# Altium schematic symbol library Regulator_Linear.SchLib: 1538 symbols (part 7 of 9) (continued)
## NCP1117-12_SOT223
designator *  value NCP1117-12_SOT223  Reference: U
ki_keywords: REGULATOR LDO 12V; ki_description: 1A Low drop-out regulator, Fixed Output 12V, SOT-223; ki_fp_filters: SOT?223*TabPin2*; Footprint: Package_TO_SOT_SMD:SOT-223-3_TabPin2; Datasheet: http://www.onsemi.com/pub_link/Collateral/NCP1117-D.PDF
pins: 1 GND, 2 VO, 3 VI

## NCP1117-12_TO252
designator *  value NCP1117-12_TO252  Reference: U
ki_keywords: REGULATOR LDO 12V; ki_description: 1A Low drop-out regulator, Fixed Output 12V, TO-252 (DPAK); ki_fp_filters: TO?252*; Footprint: Package_TO_SOT_SMD:TO-252-2; Datasheet: http://www.onsemi.com/pub_link/Collateral/NCP1117-D.PDF
pins: 1 GND, 2 VO, 3 VI

## NCP1117-ADJ_SOT223
designator *  value NCP1117-ADJ_SOT223  Reference: U
ki_keywords: REGULATOR LDO 12V; ki_description: 1A Low drop-out regulator, Adjustable Output 1.25 - 18.8V, SOT-223; ki_fp_filters: SOT?223*TabPin2*; Footprint: Package_TO_SOT_SMD:SOT-223-3_TabPin2; Datasheet: http://www.onsemi.com/pub_link/Collateral/NCP1117-D.PDF
pins: 1 ADJ, 2 VO, 3 VI

## NCP1117-ADJ_TO252
designator *  value NCP1117-ADJ_TO252  Reference: U
ki_keywords: REGULATOR LDO ADJUSTABLE; ki_description: 1A Low drop-out regulator, Adjustable Output 1.25 - 18.8V, TO-252 (DPAK); ki_fp_filters: TO?252*; Footprint: Package_TO_SOT_SMD:TO-252-2; Datasheet: http://www.onsemi.com/pub_link/Collateral/NCP1117-D.PDF
pins: 1 ADJ, 2 VO, 3 VI

## NCV8114ASN120T1G
designator *  value NCV8114ASN120T1G  Reference: U
ki_keywords: linear regulator ldo fixed positive; ki_description: 300mA, Low Noise, Linear Regulator with output active discharge function, 1.7-5.5V input voltage range, 1.2V fixed positive output, TSOT-23-5; ki_fp_filters: TSOT?23*; Footprint: Package_TO_SOT_SMD:TSOT-23-5; Datasheet: https://ru.mouser.com/datasheet/2/308/NCV8114-D-1107616.pdf
pins: 1 IN, 2 GND, 3 EN, 4 NC hidden, 5 OUT

## NCV8114ASN150T1G
designator *  value NCV8114ASN150T1G  Reference: U
ki_keywords: linear regulator ldo fixed positive; ki_description: 300mA, Low Noise, Linear Regulator with output active discharge function, 1.7-5.5V input voltage range, 1.5V fixed positive output, TSOT-23-5; ki_fp_filters: TSOT?23*; Footprint: Package_TO_SOT_SMD:TSOT-23-5; Datasheet: https://ru.mouser.com/datasheet/2/308/NCV8114-D-1107616.pdf
pins: 1 IN, 2 GND, 3 EN, 4 NC hidden, 5 OUT

## NCV8114ASN165T1G
designator *  value NCV8114ASN165T1G  Reference: U
ki_keywords: linear regulator ldo fixed positive; ki_description: 300mA, Low Noise, Linear Regulator with output active discharge function, 1.7-5.5V input voltage range, 1.65V fixed positive output, TSOT-23-5; ki_fp_filters: TSOT?23*; Footprint: Package_TO_SOT_SMD:TSOT-23-5; Datasheet: https://ru.mouser.com/datasheet/2/308/NCV8114-D-1107616.pdf
pins: 1 IN, 2 GND, 3 EN, 4 NC hidden, 5 OUT

## NCV8114ASN180T1G
designator *  value NCV8114ASN180T1G  Reference: U
ki_keywords: linear regulator ldo fixed positive; ki_description: 300mA, Low Noise, Linear Regulator with output active discharge function, 1.7-5.5V input voltage range, 1.8V fixed positive output, TSOT-23-5; ki_fp_filters: TSOT?23*; Footprint: Package_TO_SOT_SMD:TSOT-23-5; Datasheet: https://ru.mouser.com/datasheet/2/308/NCV8114-D-1107616.pdf
pins: 1 IN, 2 GND, 3 EN, 4 NC hidden, 5 OUT

## NCV8114ASN250T1G
designator *  value NCV8114ASN250T1G  Reference: U
ki_keywords: linear regulator ldo fixed positive; ki_description: 300mA, Low Noise, Linear Regulator with output active discharge function, 1.7-5.5V input voltage range, 2.5V fixed positive output, TSOT-23-5; ki_fp_filters: TSOT?23*; Footprint: Package_TO_SOT_SMD:TSOT-23-5; Datasheet: https://ru.mouser.com/datasheet/2/308/NCV8114-D-1107616.pdf
pins: 1 IN, 2 GND, 3 EN, 4 NC hidden, 5 OUT

## NCV8114ASN280T1G
designator *  value NCV8114ASN280T1G  Reference: U
ki_keywords: linear regulator ldo fixed positive; ki_description: 300mA, Low Noise, Linear Regulator with output active discharge function, 1.7-5.5V input voltage range, 2.8V fixed positive output, TSOT-23-5; ki_fp_filters: TSOT?23*; Footprint: Package_TO_SOT_SMD:TSOT-23-5; Datasheet: https://ru.mouser.com/datasheet/2/308/NCV8114-D-1107616.pdf
pins: 1 IN, 2 GND, 3 EN, 4 NC hidden, 5 OUT

## NCV8114ASN300T1G
designator *  value NCV8114ASN300T1G  Reference: U
ki_keywords: linear regulator ldo fixed positive; ki_description: 300mA, Low Noise, Linear Regulator with output active discharge function, 1.7-5.5V input voltage range, 3.0V fixed positive output, TSOT-23-5; ki_fp_filters: TSOT?23*; Footprint: Package_TO_SOT_SMD:TSOT-23-5; Datasheet: https://ru.mouser.com/datasheet/2/308/NCV8114-D-1107616.pdf
pins: 1 IN, 2 GND, 3 EN, 4 NC hidden, 5 OUT

## NCV8114ASN330T1G
designator *  value NCV8114ASN330T1G  Reference: U
ki_keywords: linear regulator ldo fixed positive; ki_description: 300mA, Low Noise, Linear Regulator with output active discharge function, 1.7-5.5V input voltage range, 3.3V fixed positive output, TSOT-23-5; ki_fp_filters: TSOT?23*; Footprint: Package_TO_SOT_SMD:TSOT-23-5; Datasheet: https://ru.mouser.com/datasheet/2/308/NCV8114-D-1107616.pdf
pins: 1 IN, 2 GND, 3 EN, 4 NC hidden, 5 OUT

## NCV8114BSN120T1G
designator *  value NCV8114BSN120T1G  Reference: U
ki_keywords: linear regulator ldo fixed positive; ki_description: 300mA, Low Noise, Linear Regulator without output active discharge function, 1.7-5.5V input voltage range, 1.2V fixed positive output, TSOT-23-5; ki_fp_filters: TSOT?23*; Footprint: Package_TO_SOT_SMD:TSOT-23-5; Datasheet: https://ru.mouser.com/datasheet/2/308/NCV8114-D-1107616.pdf
pins: 1 IN, 2 GND, 3 EN, 4 NC hidden, 5 OUT

## NCV8114BSN150T1G
designator *  value NCV8114BSN150T1G  Reference: U
ki_keywords: linear regulator ldo fixed positive; ki_description: 300mA, Low Noise, Linear Regulator without output active discharge function, 1.7-5.5V input voltage range, 1.5V fixed positive output, TSOT-23-5; ki_fp_filters: TSOT?23*; Footprint: Package_TO_SOT_SMD:TSOT-23-5; Datasheet: https://ru.mouser.com/datasheet/2/308/NCV8114-D-1107616.pdf
pins: 1 IN, 2 GND, 3 EN, 4 NC hidden, 5 OUT

## NCV8114BSN180T1G
designator *  value NCV8114BSN180T1G  Reference: U
ki_keywords: linear regulator ldo fixed positive; ki_description: 300mA, Low Noise, Linear Regulator without output active discharge function, 1.7-5.5V input voltage range, 1.8V fixed positive output, TSOT-23-5; ki_fp_filters: TSOT?23*; Footprint: Package_TO_SOT_SMD:TSOT-23-5; Datasheet: https://ru.mouser.com/datasheet/2/308/NCV8114-D-1107616.pdf
pins: 1 IN, 2 GND, 3 EN, 4 NC hidden, 5 OUT

## NCV8114BSN280T1G
designator *  value NCV8114BSN280T1G  Reference: U
ki_keywords: linear regulator ldo fixed positive; ki_description: 300mA, Low Noise, Linear Regulator without output active discharge function, 1.7-5.5V input voltage range, 2.8V fixed positive output, TSOT-23-5; ki_fp_filters: TSOT?23*; Footprint: Package_TO_SOT_SMD:TSOT-23-5; Datasheet: https://ru.mouser.com/datasheet/2/308/NCV8114-D-1107616.pdf
pins: 1 IN, 2 GND, 3 EN, 4 NC hidden, 5 OUT

## NCV8114BSN300T1G
designator *  value NCV8114BSN300T1G  Reference: U
ki_keywords: linear regulator ldo fixed positive; ki_description: 300mA, Low Noise, Linear Regulator without output active discharge function, 1.7-5.5V input voltage range, 3.0V fixed positive output, TSOT-23-5; ki_fp_filters: TSOT?23*; Footprint: Package_TO_SOT_SMD:TSOT-23-5; Datasheet: https://ru.mouser.com/datasheet/2/308/NCV8114-D-1107616.pdf
pins: 1 IN, 2 GND, 3 EN, 4 NC hidden, 5 OUT

## NCV8114BSN330T1G
designator *  value NCV8114BSN330T1G  Reference: U
ki_keywords: linear regulator ldo fixed positive; ki_description: 300mA, Low Noise, Linear Regulator without output active discharge function, 1.7-5.5V input voltage range, 3.3V fixed positive output, TSOT-23-5; ki_fp_filters: TSOT?23*; Footprint: Package_TO_SOT_SMD:TSOT-23-5; Datasheet: https://ru.mouser.com/datasheet/2/308/NCV8114-D-1107616.pdf
pins: 1 IN, 2 GND, 3 EN, 4 NC hidden, 5 OUT

## NVC8674DS50
designator *  value NVC8674DS50  Reference: U
ki_keywords: ldo regulator 5V; ki_description: 350mA, 5.0V Very Low Iq Low Dropout Linear Regulator, TO-263-2; ki_fp_filters: TO*263*; Footprint: Package_TO_SOT_SMD:TO-263-2; Datasheet: https://www.onsemi.com/pub/Collateral/NCV8674-D.PDF
pins: 1 IN, 2 GND, 3 OUT

## NVC8674DS120
designator *  value NVC8674DS120  Reference: U
ki_keywords: ldo regulator 12V; ki_description: 350mA, 12.0V Very Low Iq Low Dropout Linear Regulator, TO-263-2; ki_fp_filters: TO*263*; Footprint: Package_TO_SOT_SMD:TO-263-2; Datasheet: https://www.onsemi.com/pub/Collateral/NCV8674-D.PDF
pins: 1 IN, 2 GND, 3 OUT

## OM1323_TO220
designator *  value OM1323_TO220  Reference: U
ki_keywords: Adjustable Voltage Regulator 1.5A Negative; ki_description: Negative 1.5A 35V Adjustable Linear Regulator, TO-220; ki_fp_filters: TO?220*; Footprint: Package_TO_SOT_THT:TO-220-3_Vertical; Datasheet: http://www.irf.com/product-info/datasheets/hirel/om1323.pdf
pins: 1 ADJ, 2 VI, 3 VO

## SPX2920M3-3.3_SOT223
designator *  value SPX2920M3-3.3_SOT223  Reference: U
ki_keywords: REGULATOR LDO 3.3V; ki_description: 400mA Low drop-out regulator, Fixed Output 3.3V, SOT-223; ki_fp_filters: SOT?223*; Footprint: Package_TO_SOT_SMD:SOT-223-3_TabPin2; Datasheet: http://www.zlgmcu.com/Sipex/LDO/PDF/spx2920.pdf
pins: 1 VI, 2 GND, 3 VO

## SPX2920M3-5.0_SOT223
designator *  value SPX2920M3-5.0_SOT223  Reference: U
ki_keywords: REGULATOR LDO 5V; ki_description: 400mA Low drop-out regulator, Fixed Output 5V, SOT-223; ki_fp_filters: SOT?223*; Footprint: Package_TO_SOT_SMD:SOT-223-3_TabPin2; Datasheet: http://www.zlgmcu.com/Sipex/LDO/PDF/spx2920.pdf
pins: 1 VI, 2 GND, 3 VO

## SPX2920S-3.3_SO8
designator *  value SPX2920S-3.3_SO8  Reference: U
ki_keywords: LDO Voltage Regulator 400mA 3.3V Adjustable; ki_description: 400mA Fixed/Adjustable 1.2-20V Low Drop-out Voltage Regulator, SO-8; ki_fp_filters: SOIC*3.9x4.9mm*P1.27mm*; Footprint: Package_SO:SOIC-8_3.9x4.9mm_P1.27mm; Datasheet: http://www.zlgmcu.com/Sipex/LDO/PDF/spx2920.pdf
pins: 1 OUT, 2 SENSE, 3 ~{{SD}}, 4 GND, 5 ~{{ERROR}}, 6 TAP, 7 FB, 8 IN

## SPX2920S-5.0_SO8
designator *  value SPX2920S-5.0_SO8  Reference: U
ki_keywords: LDO Voltage Regulator 400mA 5V Adjustable; ki_description: 400mA Fixed/Adjustable 1.2-20V Low Drop-out Voltage Regulator, SO-8; ki_fp_filters: SOIC*3.9x4.9mm*P1.27mm*; Footprint: Package_SO:SOIC-8_3.9x4.9mm_P1.27mm; Datasheet: http://www.zlgmcu.com/Sipex/LDO/PDF/spx2920.pdf
pins: 1 OUT, 2 SENSE, 3 ~{{SD}}, 4 GND, 5 ~{{ERROR}}, 6 TAP, 7 FB, 8 IN

## SPX2920T-3.3_TO263
designator *  value SPX2920T-3.3_TO263  Reference: U
ki_keywords: REGULATOR LDO 3.3V; ki_description: 400mA Low drop-out regulator, Fixed Output 3.3V, TO-263; ki_fp_filters: TO?263*; Footprint: Package_TO_SOT_SMD:TO-263-3_TabPin2; Datasheet: http://www.zlgmcu.com/Sipex/LDO/PDF/spx2920.pdf
pins: 1 VI, 2 GND, 3 VO

## SPX2920T-5.0_TO263
designator *  value SPX2920T-5.0_TO263  Reference: U
ki_keywords: REGULATOR LDO 5V; ki_description: 400mA Low drop-out regulator, Fixed Output 5V, TO-263; ki_fp_filters: TO?263*; Footprint: Package_TO_SOT_SMD:TO-263-3_TabPin2; Datasheet: http://www.zlgmcu.com/Sipex/LDO/PDF/spx2920.pdf
pins: 1 VI, 2 GND, 3 VO

## SPX2920U-3.3_TO220
designator *  value SPX2920U-3.3_TO220  Reference: U
ki_keywords: REGULATOR LDO 3.3V; ki_description: 400mA Low drop-out regulator, Fixed Output 3.3V, TO-220; ki_fp_filters: TO?220*; Footprint: Package_TO_SOT_THT:TO-220-3_Vertical; Datasheet: http://www.zlgmcu.com/Sipex/LDO/PDF/spx2920.pdf
pins: 1 VI, 2 GND, 3 VO

## SPX2920U-5.0_TO220
designator *  value SPX2920U-5.0_TO220  Reference: U
ki_keywords: REGULATOR LDO 5V; ki_description: 400mA Low drop-out regulator, Fixed Output 5V, TO-220; ki_fp_filters: TO?220*; Footprint: Package_TO_SOT_THT:TO-220-3_Vertical; Datasheet: http://www.zlgmcu.com/Sipex/LDO/PDF/spx2920.pdf
pins: 1 VI, 2 GND, 3 VO

## SPX3819M5-L
designator *  value SPX3819M5-L  Reference: U
ki_keywords: REGULATOR LDO ADJ; ki_description: 500mA Low drop-out regulator, Adjustable, SOT-23-5; ki_fp_filters: SOT?23*; Footprint: Package_TO_SOT_SMD:SOT-23-5; Datasheet: https://www.exar.com/content/document.ashx?id=22106&languageid=1033&type=Datasheet&partnumber=SPX3819&filename=SPX3819.pdf&part=SPX3819
pins: 1 IN, 2 GND, 3 EN, 4 ADJ, 5 OUT

## SPX3819M5-L-1-2
designator *  value SPX3819M5-L-1-2  Reference: U
ki_keywords: REGULATOR LDO 1.2V; ki_description: 500mA Low drop-out regulator, Fixed Output 1.2V, SOT-23-5; ki_fp_filters: SOT?23*; Footprint: Package_TO_SOT_SMD:SOT-23-5; Datasheet: https://www.exar.com/content/document.ashx?id=22106&languageid=1033&type=Datasheet&partnumber=SPX3819&filename=SPX3819.pdf&part=SPX3819
pins: 1 IN, 2 GND, 3 EN, 4 BP, 5 OUT

## SPX3819M5-L-1-5
designator *  value SPX3819M5-L-1-5  Reference: U
ki_keywords: REGULATOR LDO 1.5V; ki_description: 500mA Low drop-out regulator, Fixed Output 1.5V, SOT-23-5; ki_fp_filters: SOT?23*; Footprint: Package_TO_SOT_SMD:SOT-23-5; Datasheet: https://www.exar.com/content/document.ashx?id=22106&languageid=1033&type=Datasheet&partnumber=SPX3819&filename=SPX3819.pdf&part=SPX3819
pins: 1 IN, 2 GND, 3 EN, 4 BP, 5 OUT

## SPX3819M5-L-1-8
designator *  value SPX3819M5-L-1-8  Reference: U
ki_keywords: REGULATOR LDO 1.8V; ki_description: 500mA Low drop-out regulator, Fixed Output 1.8V, SOT-23-5; ki_fp_filters: SOT?23*; Footprint: Package_TO_SOT_SMD:SOT-23-5; Datasheet: https://www.exar.com/content/document.ashx?id=22106&languageid=1033&type=Datasheet&partnumber=SPX3819&filename=SPX3819.pdf&part=SPX3819
pins: 1 IN, 2 GND, 3 EN, 4 BP, 5 OUT

## SPX3819M5-L-2-5
designator *  value SPX3819M5-L-2-5  Reference: U
ki_keywords: REGULATOR LDO 2.5V; ki_description: 500mA Low drop-out regulator, Fixed Output 2.5V, SOT-23-5; ki_fp_filters: SOT?23*; Footprint: Package_TO_SOT_SMD:SOT-23-5; Datasheet: https://www.exar.com/content/document.ashx?id=22106&languageid=1033&type=Datasheet&partnumber=SPX3819&filename=SPX3819.pdf&part=SPX3819
pins: 1 IN, 2 GND, 3 EN, 4 BP, 5 OUT

## SPX3819M5-L-3-0
designator *  value SPX3819M5-L-3-0  Reference: U
ki_keywords: REGULATOR LDO 3.0V; ki_description: 500mA Low drop-out regulator, Fixed Output 3.0V, SOT-23-5; ki_fp_filters: SOT?23*; Footprint: Package_TO_SOT_SMD:SOT-23-5; Datasheet: https://www.exar.com/content/document.ashx?id=22106&languageid=1033&type=Datasheet&partnumber=SPX3819&filename=SPX3819.pdf&part=SPX3819
pins: 1 IN, 2 GND, 3 EN, 4 BP, 5 OUT

## SPX3819M5-L-3-3
designator *  value SPX3819M5-L-3-3  Reference: U
ki_keywords: REGULATOR LDO 3.3V; ki_description: 500mA Low drop-out regulator, Fixed Output 3.3V, SOT-23-5; ki_fp_filters: SOT?23*; Footprint: Package_TO_SOT_SMD:SOT-23-5; Datasheet: https://www.exar.com/content/document.ashx?id=22106&languageid=1033&type=Datasheet&partnumber=SPX3819&filename=SPX3819.pdf&part=SPX3819
pins: 1 IN, 2 GND, 3 EN, 4 BP, 5 OUT

## SPX3819M5-L-5-0
designator *  value SPX3819M5-L-5-0  Reference: U
ki_keywords: REGULATOR LDO 5.0V; ki_description: 500mA Low drop-out regulator, Fixed Output 5.0V, SOT-23-5; ki_fp_filters: SOT?23*; Footprint: Package_TO_SOT_SMD:SOT-23-5; Datasheet: https://www.exar.com/content/document.ashx?id=22106&languageid=1033&type=Datasheet&partnumber=SPX3819&filename=SPX3819.pdf&part=SPX3819
pins: 1 IN, 2 GND, 3 EN, 4 BP, 5 OUT

## TC1014-xCT
designator *  value TC1014-xCT  Reference: U
ki_keywords: LDO Linear Voltage Regulator; ki_description: 50 mA CMOS LDOs with Shutdown and Reference Bypass, SOT-23-5; ki_fp_filters: SOT?23*; Footprint: Package_TO_SOT_SMD:SOT-23-5; Datasheet: https://ww1.microchip.com/downloads/aemDocuments/documents/APID/ProductDocuments/DataSheets/21335e.pdf
pins: 1 VIN, 2 GND, 3 ~{{SHDN}}, 4 Bypass, 5 VOUT

## TC1015-xCT
designator *  value TC1015-xCT  Reference: U
ki_keywords: LDO Linear Voltage Regulator; ki_description: 100 mA CMOS LDOs with Shutdown and Reference Bypass, SOT-23-5; ki_fp_filters: SOT?23*; Footprint: Package_TO_SOT_SMD:SOT-23-5; Datasheet: https://ww1.microchip.com/downloads/aemDocuments/documents/APID/ProductDocuments/DataSheets/21335e.pdf
pins: 1 VIN, 2 GND, 3 ~{{SHDN}}, 4 Bypass, 5 VOUT

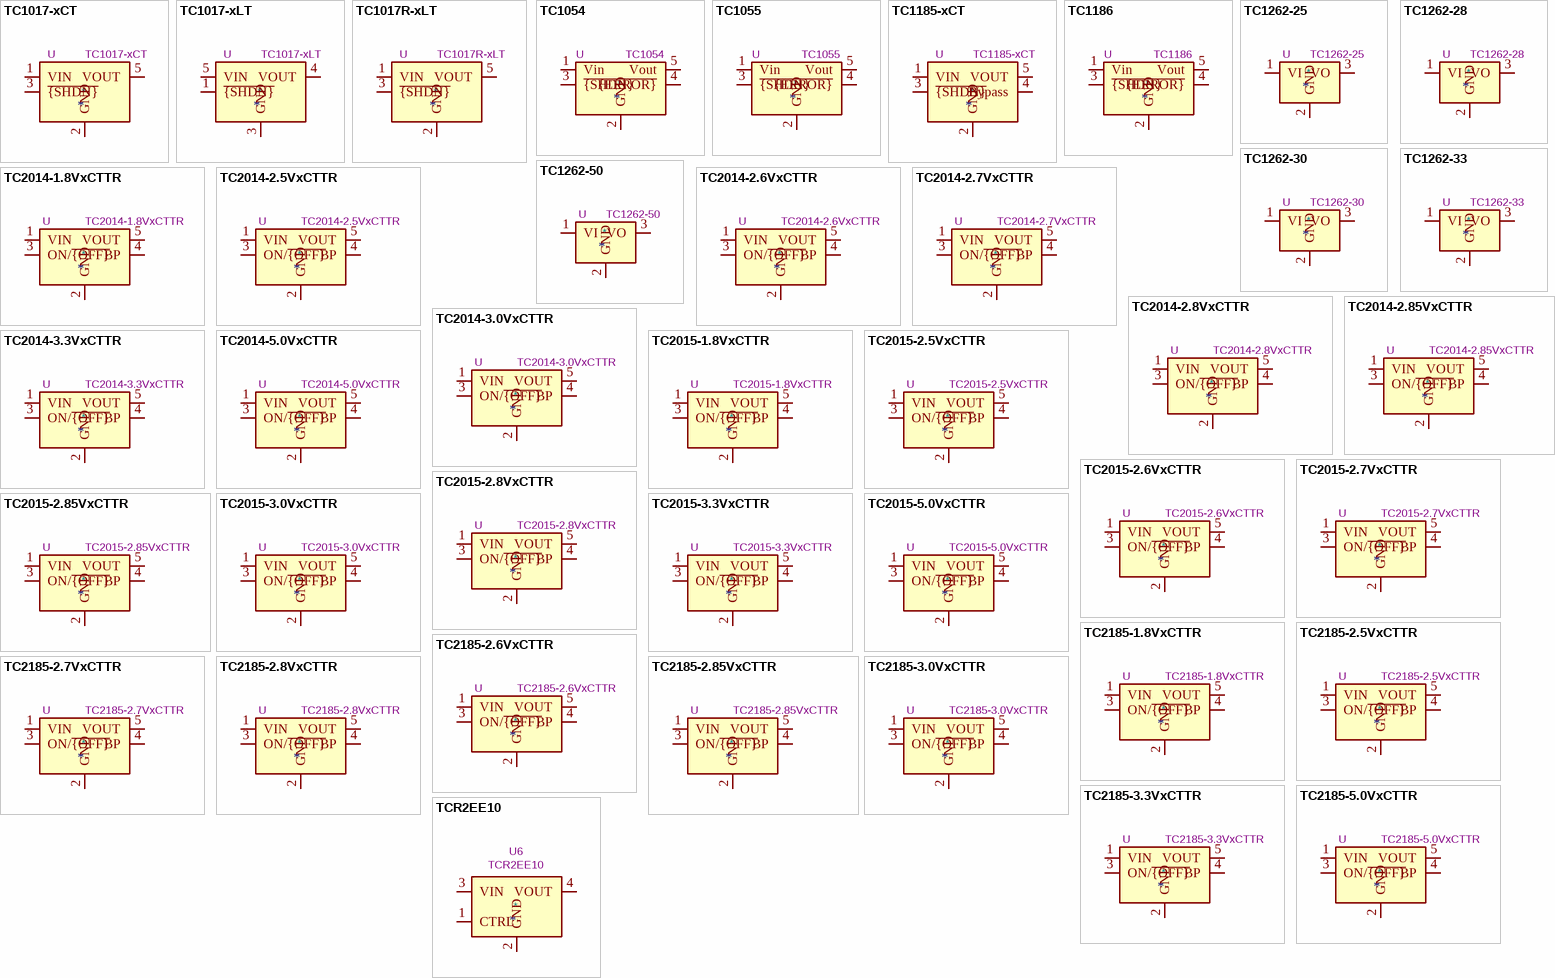
[diagram p30: symbols TC1017-xCT to TCR2EE10]

## TC1017-xCT
designator *  value TC1017-xCT  Reference: U
ki_keywords: LDO Linear Voltage Regulator; ki_description: 150mA, Tiny CMOS LDO With Shutdown, SOT-23-5; ki_fp_filters: SOT?23*; Footprint: Package_TO_SOT_SMD:SOT-23-5; Datasheet: http://ww1.microchip.com/downloads/en/DeviceDoc/21813F.pdf
pins: 1 VIN, 2 GND, 3 ~{{SHDN}}, 4 NC hidden, 5 VOUT

## TC1017-xLT
designator *  value TC1017-xLT  Reference: U
ki_keywords: LDO Linear Voltage Regulator; ki_description: 150mA, Tiny CMOS LDO With Shutdown, SC-70-5; ki_fp_filters: SOT*353*; Footprint: Package_TO_SOT_SMD:SOT-353_SC-70-5; Datasheet: http://ww1.microchip.com/downloads/en/DeviceDoc/21813F.pdf
pins: 1 ~{{SHDN}}, 2 NC hidden, 3 GND, 4 VOUT, 5 VIN

## TC1017R-xLT
designator *  value TC1017R-xLT  Reference: U
ki_keywords: LDO Linear Voltage Regulator; ki_description: 150mA, Tiny CMOS LDO With Shutdown, SC-70-5; ki_fp_filters: SOT*353*; Footprint: Package_TO_SOT_SMD:SOT-353_SC-70-5; Datasheet: http://ww1.microchip.com/downloads/en/DeviceDoc/21813F.pdf
pins: 1 VIN, 2 GND, 3 ~{{SHDN}}, 4 NC hidden, 5 VOUT

## TC1054
designator *  value TC1054  Reference: U
ki_keywords: LDO regulator voltage; ki_description: 50mA Low Dropout Regulator with ERROR output in 5-Pin SOT-23 package; ki_fp_filters: SOT?23*; Footprint: Package_TO_SOT_SMD:SOT-23-5; Datasheet: http://ww1.microchip.com/downloads/en/DeviceDoc/21350E.pdf
pins: 1 Vin, 2 GND, 3 ~{{SHDN}}, 4 ~{{ERROR}}, 5 Vout

## TC1055
designator *  value TC1055  Reference: U
ki_keywords: LDO regulator voltage; ki_description: 100mA Low Dropout Regulator with ERROR output in 5-Pin SOT-23 package; ki_fp_filters: SOT?23*; Footprint: Package_TO_SOT_SMD:SOT-23-5; Datasheet: http://ww1.microchip.com/downloads/en/DeviceDoc/21350E.pdf
pins: 1 Vin, 2 GND, 3 ~{{SHDN}}, 4 ~{{ERROR}}, 5 Vout

## TC1185-xCT
designator *  value TC1185-xCT  Reference: U
ki_keywords: LDO Linear Voltage Regulator; ki_description: 150 mA CMOS LDOs with Shutdown and Reference Bypass, SOT-23-5; ki_fp_filters: SOT?23*; Footprint: Package_TO_SOT_SMD:SOT-23-5; Datasheet: https://ww1.microchip.com/downloads/aemDocuments/documents/APID/ProductDocuments/DataSheets/21335e.pdf
pins: 1 VIN, 2 GND, 3 ~{{SHDN}}, 4 Bypass, 5 VOUT

## TC1186
designator *  value TC1186  Reference: U
ki_keywords: LDO regulator voltage; ki_description: 150mA Low Dropout Regulator with ERROR output in 5-Pin SOT-23 package; ki_fp_filters: SOT?23*; Footprint: Package_TO_SOT_SMD:SOT-23-5; Datasheet: http://ww1.microchip.com/downloads/en/DeviceDoc/21350E.pdf
pins: 1 Vin, 2 GND, 3 ~{{SHDN}}, 4 ~{{ERROR}}, 5 Vout

## TC1262-25
designator *  value TC1262-25  Reference: U
ki_keywords: Voltage Regulator 2.5V 500mA Positive CMOS LDO Microchip; ki_description: 500mA Low Dropout CMOS Voltage Regulator, Fixed Output 2.5V, TO-220/SOT-223/TO-263; ki_fp_filters: SOT?223* TO?220* TO?263*; Datasheet: http://ww1.microchip.com/downloads/en/DeviceDoc/21373C.pdf
pins: 1 VI, 2 GND, 3 VO

## TC1262-28
designator *  value TC1262-28  Reference: U
ki_keywords: Voltage Regulator 2.8V 500mA Positive CMOS LDO Microchip; ki_description: 500mA Low Dropout CMOS Voltage Regulator, Fixed Output 2.8V, TO-220/SOT-223/TO-263; ki_fp_filters: SOT?223* TO?220* TO?263*; Datasheet: http://ww1.microchip.com/downloads/en/DeviceDoc/21373C.pdf
pins: 1 VI, 2 GND, 3 VO

## TC1262-30
designator *  value TC1262-30  Reference: U
ki_keywords: Voltage Regulator 3.0V 500mA Positive CMOS LDO Microchip; ki_description: 500mA Low Dropout CMOS Voltage Regulator, Fixed Output 3.0V, TO-220/SOT-223/TO-263; ki_fp_filters: SOT?223* TO?220* TO?263*; Datasheet: http://ww1.microchip.com/downloads/en/DeviceDoc/21373C.pdf
pins: 1 VI, 2 GND, 3 VO

## TC1262-33
designator *  value TC1262-33  Reference: U
ki_keywords: Voltage Regulator 3.3V 500mA Positive CMOS LDO Microchip; ki_description: 500mA Low Dropout CMOS Voltage Regulator, Fixed Output 3.3V, TO-220/SOT-223/TO-263; ki_fp_filters: SOT?223* TO?220* TO?263*; Datasheet: http://ww1.microchip.com/downloads/en/DeviceDoc/21373C.pdf
pins: 1 VI, 2 GND, 3 VO

## TC1262-50
designator *  value TC1262-50  Reference: U
ki_keywords: Voltage Regulator 5.0V 500mA Positive CMOS LDO Microchip; ki_description: 500mA Low Dropout CMOS Voltage Regulator, Fixed Output 5.0V, TO-220/SOT-223/TO-263; ki_fp_filters: SOT?223* TO?220* TO?263*; Datasheet: http://ww1.microchip.com/downloads/en/DeviceDoc/21373C.pdf
pins: 1 VI, 2 GND, 3 VO

## TC2014-1.8VxCTTR
designator *  value TC2014-1.8VxCTTR  Reference: U
ki_keywords: low dropout 1.8V 50mA; ki_description: 1.8V 50mA CMOS LDO with Shutdown and Vref Bypass, SOT-23-5; ki_fp_filters: SOT?23*; Footprint: Package_TO_SOT_SMD:SOT-23-5; Datasheet: http://ww1.microchip.com/downloads/en/DeviceDoc/21662F.pdf
pins: 1 VIN, 2 GND, 3 ON/~{{OFF}}, 4 BP, 5 VOUT

## TC2014-2.5VxCTTR
designator *  value TC2014-2.5VxCTTR  Reference: U
ki_keywords: low dropout 2.5V 50mA; ki_description: 2.5V 50mA CMOS LDO with Shutdown and Vref Bypass, SOT-23-5; ki_fp_filters: SOT?23*; Footprint: Package_TO_SOT_SMD:SOT-23-5; Datasheet: http://ww1.microchip.com/downloads/en/DeviceDoc/21662F.pdf
pins: 1 VIN, 2 GND, 3 ON/~{{OFF}}, 4 BP, 5 VOUT

## TC2014-2.6VxCTTR
designator *  value TC2014-2.6VxCTTR  Reference: U
ki_keywords: low dropout 2.6V 50mA; ki_description: 2.6V 50mA CMOS LDO with Shutdown and Vref Bypass, SOT-23-5; ki_fp_filters: SOT?23*; Footprint: Package_TO_SOT_SMD:SOT-23-5; Datasheet: http://ww1.microchip.com/downloads/en/DeviceDoc/21662F.pdf
pins: 1 VIN, 2 GND, 3 ON/~{{OFF}}, 4 BP, 5 VOUT

## TC2014-2.7VxCTTR
designator *  value TC2014-2.7VxCTTR  Reference: U
ki_keywords: low dropout 2.7V 50mA; ki_description: 2.7V 50mA CMOS LDO with Shutdown and Vref Bypass, SOT-23-5; ki_fp_filters: SOT?23*; Footprint: Package_TO_SOT_SMD:SOT-23-5; Datasheet: http://ww1.microchip.com/downloads/en/DeviceDoc/21662F.pdf
pins: 1 VIN, 2 GND, 3 ON/~{{OFF}}, 4 BP, 5 VOUT

## TC2014-2.8VxCTTR
designator *  value TC2014-2.8VxCTTR  Reference: U
ki_keywords: low dropout 2.8V 50mA; ki_description: 2.8V 50mA CMOS LDO with Shutdown and Vref Bypass, SOT-23-5; ki_fp_filters: SOT?23*; Footprint: Package_TO_SOT_SMD:SOT-23-5; Datasheet: http://ww1.microchip.com/downloads/en/DeviceDoc/21662F.pdf
pins: 1 VIN, 2 GND, 3 ON/~{{OFF}}, 4 BP, 5 VOUT

## TC2014-2.85VxCTTR
designator *  value TC2014-2.85VxCTTR  Reference: U
ki_keywords: low dropout 2.85V 50mA; ki_description: 2.85V 50mA CMOS LDO with Shutdown and Vref Bypass, SOT-23-5; ki_fp_filters: SOT?23*; Footprint: Package_TO_SOT_SMD:SOT-23-5; Datasheet: http://ww1.microchip.com/downloads/en/DeviceDoc/21662F.pdf
pins: 1 VIN, 2 GND, 3 ON/~{{OFF}}, 4 BP, 5 VOUT

## TC2014-3.0VxCTTR
designator *  value TC2014-3.0VxCTTR  Reference: U
ki_keywords: low dropout 3.0V 50mA; ki_description: 3.0V 50mA CMOS LDO with Shutdown and Vref Bypass, SOT-23-5; ki_fp_filters: SOT?23*; Footprint: Package_TO_SOT_SMD:SOT-23-5; Datasheet: http://ww1.microchip.com/downloads/en/DeviceDoc/21662F.pdf
pins: 1 VIN, 2 GND, 3 ON/~{{OFF}}, 4 BP, 5 VOUT

## TC2014-3.3VxCTTR
designator *  value TC2014-3.3VxCTTR  Reference: U
ki_keywords: low dropout 3.3V 50mA; ki_description: 3.3V 50mA CMOS LDO with Shutdown and Vref Bypass, SOT-23-5; ki_fp_filters: SOT?23*; Footprint: Package_TO_SOT_SMD:SOT-23-5; Datasheet: http://ww1.microchip.com/downloads/en/DeviceDoc/21662F.pdf
pins: 1 VIN, 2 GND, 3 ON/~{{OFF}}, 4 BP, 5 VOUT

## TC2014-5.0VxCTTR
designator *  value TC2014-5.0VxCTTR  Reference: U
ki_keywords: low dropout 5.0V 50mA; ki_description: 5.0V 50mA CMOS LDO with Shutdown and Vref Bypass, SOT-23-5; ki_fp_filters: SOT?23*; Footprint: Package_TO_SOT_SMD:SOT-23-5; Datasheet: http://ww1.microchip.com/downloads/en/DeviceDoc/21662F.pdf
pins: 1 VIN, 2 GND, 3 ON/~{{OFF}}, 4 BP, 5 VOUT

## TC2015-1.8VxCTTR
designator *  value TC2015-1.8VxCTTR  Reference: U
ki_keywords: low dropout 1.8V 100mA; ki_description: 1.8V 100mA CMOS LDO with Shutdown and Vref Bypass, SOT-23-5; ki_fp_filters: SOT?23*; Footprint: Package_TO_SOT_SMD:SOT-23-5; Datasheet: http://ww1.microchip.com/downloads/en/DeviceDoc/21662F.pdf
pins: 1 VIN, 2 GND, 3 ON/~{{OFF}}, 4 BP, 5 VOUT

## TC2015-2.5VxCTTR
designator *  value TC2015-2.5VxCTTR  Reference: U
ki_keywords: low dropout 2.5V 100mA; ki_description: 2.5V 100mA CMOS LDO with Shutdown and Vref Bypass, SOT-23-5; ki_fp_filters: SOT?23*; Footprint: Package_TO_SOT_SMD:SOT-23-5; Datasheet: http://ww1.microchip.com/downloads/en/DeviceDoc/21662F.pdf
pins: 1 VIN, 2 GND, 3 ON/~{{OFF}}, 4 BP, 5 VOUT

## TC2015-2.6VxCTTR
designator *  value TC2015-2.6VxCTTR  Reference: U
ki_keywords: low dropout 2.6V 100mA; ki_description: 2.6V 100mA CMOS LDO with Shutdown and Vref Bypass, SOT-23-5; ki_fp_filters: SOT?23*; Footprint: Package_TO_SOT_SMD:SOT-23-5; Datasheet: http://ww1.microchip.com/downloads/en/DeviceDoc/21662F.pdf
pins: 1 VIN, 2 GND, 3 ON/~{{OFF}}, 4 BP, 5 VOUT

## TC2015-2.7VxCTTR
designator *  value TC2015-2.7VxCTTR  Reference: U
ki_keywords: low dropout 2.7V 100mA; ki_description: 2.7V 100mA CMOS LDO with Shutdown and Vref Bypass, SOT-23-5; ki_fp_filters: SOT?23*; Footprint: Package_TO_SOT_SMD:SOT-23-5; Datasheet: http://ww1.microchip.com/downloads/en/DeviceDoc/21662F.pdf
pins: 1 VIN, 2 GND, 3 ON/~{{OFF}}, 4 BP, 5 VOUT

## TC2015-2.8VxCTTR
designator *  value TC2015-2.8VxCTTR  Reference: U
ki_keywords: low dropout 2.8V 100mA; ki_description: 2.8V 100mA CMOS LDO with Shutdown and Vref Bypass, SOT-23-5; ki_fp_filters: SOT?23*; Footprint: Package_TO_SOT_SMD:SOT-23-5; Datasheet: http://ww1.microchip.com/downloads/en/DeviceDoc/21662F.pdf
pins: 1 VIN, 2 GND, 3 ON/~{{OFF}}, 4 BP, 5 VOUT

## TC2015-2.85VxCTTR
designator *  value TC2015-2.85VxCTTR  Reference: U
ki_keywords: low dropout 2.85V 100mA; ki_description: 2.85V 100mA CMOS LDO with Shutdown and Vref Bypass, SOT-23-5; ki_fp_filters: SOT?23*; Footprint: Package_TO_SOT_SMD:SOT-23-5; Datasheet: http://ww1.microchip.com/downloads/en/DeviceDoc/21662F.pdf
pins: 1 VIN, 2 GND, 3 ON/~{{OFF}}, 4 BP, 5 VOUT

## TC2015-3.0VxCTTR
designator *  value TC2015-3.0VxCTTR  Reference: U
ki_keywords: low dropout 3.0V 100mA; ki_description: 3.0V 100mA CMOS LDO with Shutdown and Vref Bypass, SOT-23-5; ki_fp_filters: SOT?23*; Footprint: Package_TO_SOT_SMD:SOT-23-5; Datasheet: http://ww1.microchip.com/downloads/en/DeviceDoc/21662F.pdf
pins: 1 VIN, 2 GND, 3 ON/~{{OFF}}, 4 BP, 5 VOUT

## TC2015-3.3VxCTTR
designator *  value TC2015-3.3VxCTTR  Reference: U
ki_keywords: low dropout 3.3V 100mA; ki_description: 3.3V 100mA CMOS LDO with Shutdown and Vref Bypass, SOT-23-5; ki_fp_filters: SOT?23*; Footprint: Package_TO_SOT_SMD:SOT-23-5; Datasheet: http://ww1.microchip.com/downloads/en/DeviceDoc/21662F.pdf
pins: 1 VIN, 2 GND, 3 ON/~{{OFF}}, 4 BP, 5 VOUT

## TC2015-5.0VxCTTR
designator *  value TC2015-5.0VxCTTR  Reference: U
ki_keywords: low dropout 5.0V 100mA; ki_description: 5.0V 100mA CMOS LDO with Shutdown and Vref Bypass, SOT-23-5; ki_fp_filters: SOT?23*; Footprint: Package_TO_SOT_SMD:SOT-23-5; Datasheet: http://ww1.microchip.com/downloads/en/DeviceDoc/21662F.pdf
pins: 1 VIN, 2 GND, 3 ON/~{{OFF}}, 4 BP, 5 VOUT

## TC2185-1.8VxCTTR
designator *  value TC2185-1.8VxCTTR  Reference: U
ki_keywords: low dropout 1.8V 150mA; ki_description: 1.8V 150mA CMOS LDO with Shutdown and Vref Bypass, SOT-23-5; ki_fp_filters: SOT?23*; Footprint: Package_TO_SOT_SMD:SOT-23-5; Datasheet: http://ww1.microchip.com/downloads/en/DeviceDoc/21662F.pdf
pins: 1 VIN, 2 GND, 3 ON/~{{OFF}}, 4 BP, 5 VOUT

## TC2185-2.5VxCTTR
designator *  value TC2185-2.5VxCTTR  Reference: U
ki_keywords: low dropout 2.5V 150mA; ki_description: 2.5V 150mA CMOS LDO with Shutdown and Vref Bypass, SOT-23-5; ki_fp_filters: SOT?23*; Footprint: Package_TO_SOT_SMD:SOT-23-5; Datasheet: http://ww1.microchip.com/downloads/en/DeviceDoc/21662F.pdf
pins: 1 VIN, 2 GND, 3 ON/~{{OFF}}, 4 BP, 5 VOUT

## TC2185-2.6VxCTTR
designator *  value TC2185-2.6VxCTTR  Reference: U
ki_keywords: low dropout 2.6V 150mA; ki_description: 2.6V 150mA CMOS LDO with Shutdown and Vref Bypass, SOT-23-5; ki_fp_filters: SOT?23*; Footprint: Package_TO_SOT_SMD:SOT-23-5; Datasheet: http://ww1.microchip.com/downloads/en/DeviceDoc/21662F.pdf
pins: 1 VIN, 2 GND, 3 ON/~{{OFF}}, 4 BP, 5 VOUT

## TC2185-2.7VxCTTR
designator *  value TC2185-2.7VxCTTR  Reference: U
ki_keywords: low dropout 2.7V 150mA; ki_description: 2.7V 150mA CMOS LDO with Shutdown and Vref Bypass, SOT-23-5; ki_fp_filters: SOT?23*; Footprint: Package_TO_SOT_SMD:SOT-23-5; Datasheet: http://ww1.microchip.com/downloads/en/DeviceDoc/21662F.pdf
pins: 1 VIN, 2 GND, 3 ON/~{{OFF}}, 4 BP, 5 VOUT

## TC2185-2.8VxCTTR
designator *  value TC2185-2.8VxCTTR  Reference: U
ki_keywords: low dropout 2.8V 150mA; ki_description: 2.8V 150mA CMOS LDO with Shutdown and Vref Bypass, SOT-23-5; ki_fp_filters: SOT?23*; Footprint: Package_TO_SOT_SMD:SOT-23-5; Datasheet: http://ww1.microchip.com/downloads/en/DeviceDoc/21662F.pdf
pins: 1 VIN, 2 GND, 3 ON/~{{OFF}}, 4 BP, 5 VOUT

## TC2185-2.85VxCTTR
designator *  value TC2185-2.85VxCTTR  Reference: U
ki_keywords: low dropout 2.85V 150mA; ki_description: 2.85V 150mA CMOS LDO with Shutdown and Vref Bypass, SOT-23-5; ki_fp_filters: SOT?23*; Footprint: Package_TO_SOT_SMD:SOT-23-5; Datasheet: http://ww1.microchip.com/downloads/en/DeviceDoc/21662F.pdf
pins: 1 VIN, 2 GND, 3 ON/~{{OFF}}, 4 BP, 5 VOUT

## TC2185-3.0VxCTTR
designator *  value TC2185-3.0VxCTTR  Reference: U
ki_keywords: low dropout 3.0V 150mA; ki_description: 3.0V 50mA CMOS LDO with Shutdown and Vref Bypass, SOT-23-5; ki_fp_filters: SOT?23*; Footprint: Package_TO_SOT_SMD:SOT-23-5; Datasheet: http://ww1.microchip.com/downloads/en/DeviceDoc/21662F.pdf
pins: 1 VIN, 2 GND, 3 ON/~{{OFF}}, 4 BP, 5 VOUT

## TC2185-3.3VxCTTR
designator *  value TC2185-3.3VxCTTR  Reference: U
ki_keywords: low dropout 3.3V 150mA; ki_description: 3.3V 150mA CMOS LDO with Shutdown and Vref Bypass, SOT-23-5; ki_fp_filters: SOT?23*; Footprint: Package_TO_SOT_SMD:SOT-23-5; Datasheet: http://ww1.microchip.com/downloads/en/DeviceDoc/21662F.pdf
pins: 1 VIN, 2 GND, 3 ON/~{{OFF}}, 4 BP, 5 VOUT

## TC2185-5.0VxCTTR
designator *  value TC2185-5.0VxCTTR  Reference: U
ki_keywords: low dropout 5.0V 150mA; ki_description: 5.0V 150mA CMOS LDO with Shutdown and Vref Bypass, SOT-23-5; ki_fp_filters: SOT?23*; Footprint: Package_TO_SOT_SMD:SOT-23-5; Datasheet: http://ww1.microchip.com/downloads/en/DeviceDoc/21662F.pdf
pins: 1 VIN, 2 GND, 3 ON/~{{OFF}}, 4 BP, 5 VOUT

## TCR2EE10
designator *  value TCR2EE10  Reference: U6
ki_keywords: TOSHIBA LDO voltage regulator; ki_description: 200mA Low-dropout Voltage Regulator, Vout 1.0V, Vin up to 5.5V, SOT-553; ki_fp_filters: SOT?553*; Footprint: Package_TO_SOT_SMD:SOT-553; Datasheet: https://toshiba.semicon-storage.com/info/docget.jsp?did=13794&prodName=TCR2EF45
pins: 1 CTRL, 2 GND, 3 VIN, 4 VOUT, 5 NC hidden

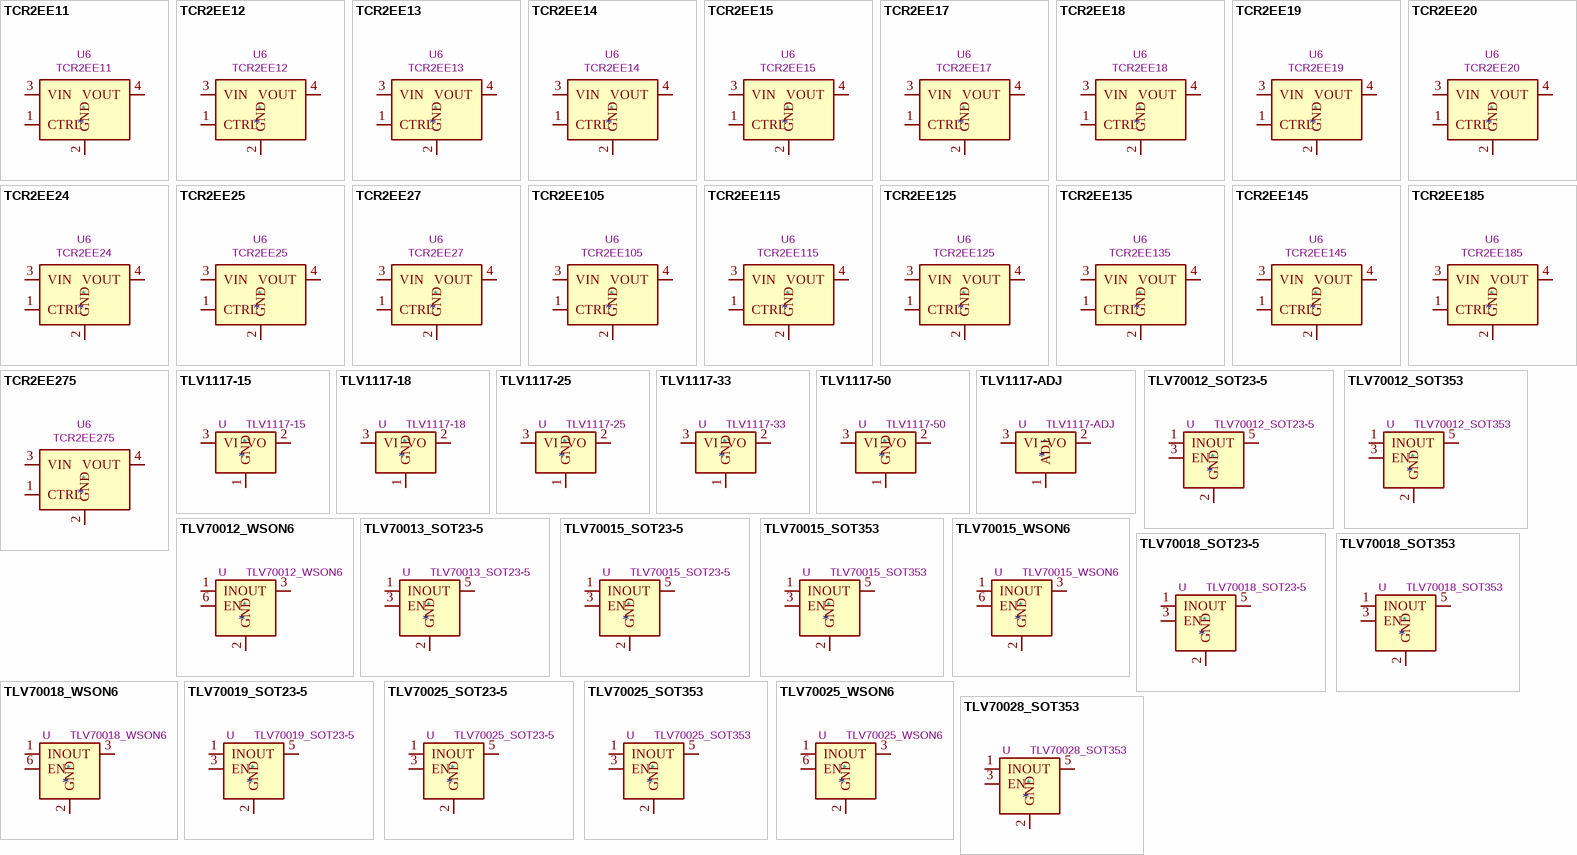
[diagram p31: symbols TCR2EE11 to TLV70028_SOT353]

## TCR2EE11
designator *  value TCR2EE11  Reference: U6
ki_keywords: TOSHIBA LDO voltage regulator; ki_description: 200mA Low-dropout Voltage Regulator, Vout 1.1V, Vin up to 5.5V, SOT-553; ki_fp_filters: SOT?553*; Footprint: Package_TO_SOT_SMD:SOT-553; Datasheet: https://toshiba.semicon-storage.com/info/docget.jsp?did=13794&prodName=TCR2EF45
pins: 1 CTRL, 2 GND, 3 VIN, 4 VOUT, 5 NC hidden

## TCR2EE12
designator *  value TCR2EE12  Reference: U6
ki_keywords: TOSHIBA LDO voltage regulator; ki_description: 200mA Low-dropout Voltage Regulator, Vout 1.2V, Vin up to 5.5V, SOT-553; ki_fp_filters: SOT?553*; Footprint: Package_TO_SOT_SMD:SOT-553; Datasheet: https://toshiba.semicon-storage.com/info/docget.jsp?did=13794&prodName=TCR2EF45
pins: 1 CTRL, 2 GND, 3 VIN, 4 VOUT, 5 NC hidden

## TCR2EE13
designator *  value TCR2EE13  Reference: U6
ki_keywords: TOSHIBA LDO voltage regulator; ki_description: 200mA Low-dropout Voltage Regulator, Vout 1.3V, Vin up to 5.5V, SOT-553; ki_fp_filters: SOT?553*; Footprint: Package_TO_SOT_SMD:SOT-553; Datasheet: https://toshiba.semicon-storage.com/info/docget.jsp?did=13794&prodName=TCR2EF45
pins: 1 CTRL, 2 GND, 3 VIN, 4 VOUT, 5 NC hidden

## TCR2EE14
designator *  value TCR2EE14  Reference: U6
ki_keywords: TOSHIBA LDO voltage regulator; ki_description: 200mA Low-dropout Voltage Regulator, Vout 1.4V, Vin up to 5.5V, SOT-553; ki_fp_filters: SOT?553*; Footprint: Package_TO_SOT_SMD:SOT-553; Datasheet: https://toshiba.semicon-storage.com/info/docget.jsp?did=13794&prodName=TCR2EF45
pins: 1 CTRL, 2 GND, 3 VIN, 4 VOUT, 5 NC hidden

## TCR2EE15
designator *  value TCR2EE15  Reference: U6
ki_keywords: TOSHIBA LDO voltage regulator; ki_description: 200mA Low-dropout Voltage Regulator, Vout 1.5V, Vin up to 5.5V, SOT-553; ki_fp_filters: SOT?553*; Footprint: Package_TO_SOT_SMD:SOT-553; Datasheet: https://toshiba.semicon-storage.com/info/docget.jsp?did=13794&prodName=TCR2EF45
pins: 1 CTRL, 2 GND, 3 VIN, 4 VOUT, 5 NC hidden

## TCR2EE17
designator *  value TCR2EE17  Reference: U6
ki_keywords: TOSHIBA LDO voltage regulator; ki_description: 200mA Low-dropout Voltage Regulator, Vout 1.7V, Vin up to 5.5V, SOT-553; ki_fp_filters: SOT?553*; Footprint: Package_TO_SOT_SMD:SOT-553; Datasheet: https://toshiba.semicon-storage.com/info/docget.jsp?did=13794&prodName=TCR2EF45
pins: 1 CTRL, 2 GND, 3 VIN, 4 VOUT, 5 NC hidden

## TCR2EE18
designator *  value TCR2EE18  Reference: U6
ki_keywords: TOSHIBA LDO voltage regulator; ki_description: 200mA Low-dropout Voltage Regulator, Vout 1.8V, Vin up to 5.5V, SOT-553; ki_fp_filters: SOT?553*; Footprint: Package_TO_SOT_SMD:SOT-553; Datasheet: https://toshiba.semicon-storage.com/info/docget.jsp?did=13794&prodName=TCR2EF45
pins: 1 CTRL, 2 GND, 3 VIN, 4 VOUT, 5 NC hidden

## TCR2EE19
designator *  value TCR2EE19  Reference: U6
ki_keywords: TOSHIBA LDO voltage regulator; ki_description: 200mA Low-dropout Voltage Regulator, Vout 1.9V, Vin up to 5.5V, SOT-553; ki_fp_filters: SOT?553*; Footprint: Package_TO_SOT_SMD:SOT-553; Datasheet: https://toshiba.semicon-storage.com/info/docget.jsp?did=13794&prodName=TCR2EF45
pins: 1 CTRL, 2 GND, 3 VIN, 4 VOUT, 5 NC hidden

## TCR2EE20
designator *  value TCR2EE20  Reference: U6
ki_keywords: TOSHIBA LDO voltage regulator; ki_description: 200mA Low-dropout Voltage Regulator, Vout 2.0V, Vin up to 5.5V, SOT-553; ki_fp_filters: SOT?553*; Footprint: Package_TO_SOT_SMD:SOT-553; Datasheet: https://toshiba.semicon-storage.com/info/docget.jsp?did=13794&prodName=TCR2EF45
pins: 1 CTRL, 2 GND, 3 VIN, 4 VOUT, 5 NC hidden

## TCR2EE24
designator *  value TCR2EE24  Reference: U6
ki_keywords: TOSHIBA LDO voltage regulator; ki_description: 200mA Low-dropout Voltage Regulator, Vout 2.4V, Vin up to 5.5V, SOT-553; ki_fp_filters: SOT?553*; Footprint: Package_TO_SOT_SMD:SOT-553; Datasheet: https://toshiba.semicon-storage.com/info/docget.jsp?did=13794&prodName=TCR2EF45
pins: 1 CTRL, 2 GND, 3 VIN, 4 VOUT, 5 NC hidden

## TCR2EE25
designator *  value TCR2EE25  Reference: U6
ki_keywords: TOSHIBA LDO voltage regulator; ki_description: 200mA Low-dropout Voltage Regulator, Vout 2.5V, Vin up to 5.5V, SOT-553; ki_fp_filters: SOT?553*; Footprint: Package_TO_SOT_SMD:SOT-553; Datasheet: https://toshiba.semicon-storage.com/info/docget.jsp?did=13794&prodName=TCR2EF45
pins: 1 CTRL, 2 GND, 3 VIN, 4 VOUT, 5 NC hidden

## TCR2EE27
designator *  value TCR2EE27  Reference: U6
ki_keywords: TOSHIBA LDO voltage regulator; ki_description: 200mA Low-dropout Voltage Regulator, Vout 2.7V, Vin up to 5.5V, SOT-553; ki_fp_filters: SOT?553*; Footprint: Package_TO_SOT_SMD:SOT-553; Datasheet: https://toshiba.semicon-storage.com/info/docget.jsp?did=13794&prodName=TCR2EF45
pins: 1 CTRL, 2 GND, 3 VIN, 4 VOUT, 5 NC hidden

## TCR2EE105
designator *  value TCR2EE105  Reference: U6
ki_keywords: TOSHIBA LDO voltage regulator; ki_description: 200mA Low-dropout Voltage Regulator, Vout 1.05V, Vin up to 5.5V, SOT-553; ki_fp_filters: SOT?553*; Footprint: Package_TO_SOT_SMD:SOT-553; Datasheet: https://toshiba.semicon-storage.com/info/docget.jsp?did=13794&prodName=TCR2EF45
pins: 1 CTRL, 2 GND, 3 VIN, 4 VOUT, 5 NC hidden

## TCR2EE115
designator *  value TCR2EE115  Reference: U6
ki_keywords: TOSHIBA LDO voltage regulator; ki_description: 200mA Low-dropout Voltage Regulator, Vout 1.15V, Vin up to 5.5V, SOT-553; ki_fp_filters: SOT?553*; Footprint: Package_TO_SOT_SMD:SOT-553; Datasheet: https://toshiba.semicon-storage.com/info/docget.jsp?did=13794&prodName=TCR2EF45
pins: 1 CTRL, 2 GND, 3 VIN, 4 VOUT, 5 NC hidden

## TCR2EE125
designator *  value TCR2EE125  Reference: U6
ki_keywords: TOSHIBA LDO voltage regulator; ki_description: 200mA Low-dropout Voltage Regulator, Vout 1.25V, Vin up to 5.5V, SOT-553; ki_fp_filters: SOT?553*; Footprint: Package_TO_SOT_SMD:SOT-553; Datasheet: https://toshiba.semicon-storage.com/info/docget.jsp?did=13794&prodName=TCR2EF45
pins: 1 CTRL, 2 GND, 3 VIN, 4 VOUT, 5 NC hidden

## TCR2EE135
designator *  value TCR2EE135  Reference: U6
ki_keywords: TOSHIBA LDO voltage regulator; ki_description: 200mA Low-dropout Voltage Regulator, Vout 1.35V, Vin up to 5.5V, SOT-553; ki_fp_filters: SOT?553*; Footprint: Package_TO_SOT_SMD:SOT-553; Datasheet: https://toshiba.semicon-storage.com/info/docget.jsp?did=13794&prodName=TCR2EF45
pins: 1 CTRL, 2 GND, 3 VIN, 4 VOUT, 5 NC hidden

## TCR2EE145
designator *  value TCR2EE145  Reference: U6
ki_keywords: TOSHIBA LDO voltage regulator; ki_description: 200mA Low-dropout Voltage Regulator, Vout 1.45V, Vin up to 5.5V, SOT-553; ki_fp_filters: SOT?553*; Footprint: Package_TO_SOT_SMD:SOT-553; Datasheet: https://toshiba.semicon-storage.com/info/docget.jsp?did=13794&prodName=TCR2EF45
pins: 1 CTRL, 2 GND, 3 VIN, 4 VOUT, 5 NC hidden

## TCR2EE185
designator *  value TCR2EE185  Reference: U6
ki_keywords: TOSHIBA LDO voltage regulator; ki_description: 200mA Low-dropout Voltage Regulator, Vout 1.85V, Vin up to 5.5V, SOT-553; ki_fp_filters: SOT?553*; Footprint: Package_TO_SOT_SMD:SOT-553; Datasheet: https://toshiba.semicon-storage.com/info/docget.jsp?did=13794&prodName=TCR2EF45
pins: 1 CTRL, 2 GND, 3 VIN, 4 VOUT, 5 NC hidden

## TCR2EE275
designator *  value TCR2EE275  Reference: U6
ki_keywords: TOSHIBA LDO voltage regulator; ki_description: 200mA Low-dropout Voltage Regulator, Vout 2.75V, Vin up to 5.5V, SOT-553; ki_fp_filters: SOT?553*; Footprint: Package_TO_SOT_SMD:SOT-553; Datasheet: https://toshiba.semicon-storage.com/info/docget.jsp?did=13794&prodName=TCR2EF45
pins: 1 CTRL, 2 GND, 3 VIN, 4 VOUT, 5 NC hidden

## TLV1117-15
designator *  value TLV1117-15  Reference: U
ki_keywords: linear regulator ldo fixed positive; ki_description: 800mA Low-Dropout Linear Regulator, 1.5V fixed output, TO-220/TO-252/TO-263/SOT-223; ki_fp_filters: SOT?223* TO?263* TO?252* TO?220*; Datasheet: http://www.ti.com/lit/ds/symlink/tlv1117.pdf
pins: 1 GND, 2 VO, 3 VI

## TLV1117-18
designator *  value TLV1117-18  Reference: U
ki_keywords: linear regulator ldo fixed positive; ki_description: 800mA Low-Dropout Linear Regulator, 1.8V fixed output, TO-220/TO-252/TO-263/SOT-223; ki_fp_filters: SOT?223* TO?263* TO?252* TO?220*; Datasheet: http://www.ti.com/lit/ds/symlink/tlv1117.pdf
pins: 1 GND, 2 VO, 3 VI

## TLV1117-25
designator *  value TLV1117-25  Reference: U
ki_keywords: linear regulator ldo fixed positive; ki_description: 800mA Low-Dropout Linear Regulator, 2.5V fixed output, TO-220/TO-252/TO-263/SOT-223; ki_fp_filters: SOT?223* TO?263* TO?252* TO?220*; Datasheet: http://www.ti.com/lit/ds/symlink/tlv1117.pdf
pins: 1 GND, 2 VO, 3 VI

## TLV1117-33
designator *  value TLV1117-33  Reference: U
ki_keywords: linear regulator ldo fixed positive; ki_description: 800mA Low-Dropout Linear Regulator, 3.3V fixed output, TO-220/TO-252/TO-263/SOT-223; ki_fp_filters: SOT?223* TO?263* TO?252* TO?220*; Datasheet: http://www.ti.com/lit/ds/symlink/tlv1117.pdf
pins: 1 GND, 2 VO, 3 VI

## TLV1117-50
designator *  value TLV1117-50  Reference: U
ki_keywords: linear regulator ldo fixed positive; ki_description: 800mA Low-Dropout Linear Regulator, 5.0V fixed output, TO-220/TO-252/TO-263/SOT-223; ki_fp_filters: SOT?223* TO?263* TO?252* TO?220*; Datasheet: http://www.ti.com/lit/ds/symlink/tlv1117.pdf
pins: 1 GND, 2 VO, 3 VI